# Altium footprint library Components.PcbLib: 139 footprints (part 1 of 9)
Each footprint in its own frame and in the unit in brackets; x right, y up, seen from the top. Pads: shape width x height; smd on the part's side, far side on the other; paste and mask are expansions set on the pad; w line width, h text height; cw(c..) or ccw(c..) is an arc to the next point about the centre after c.
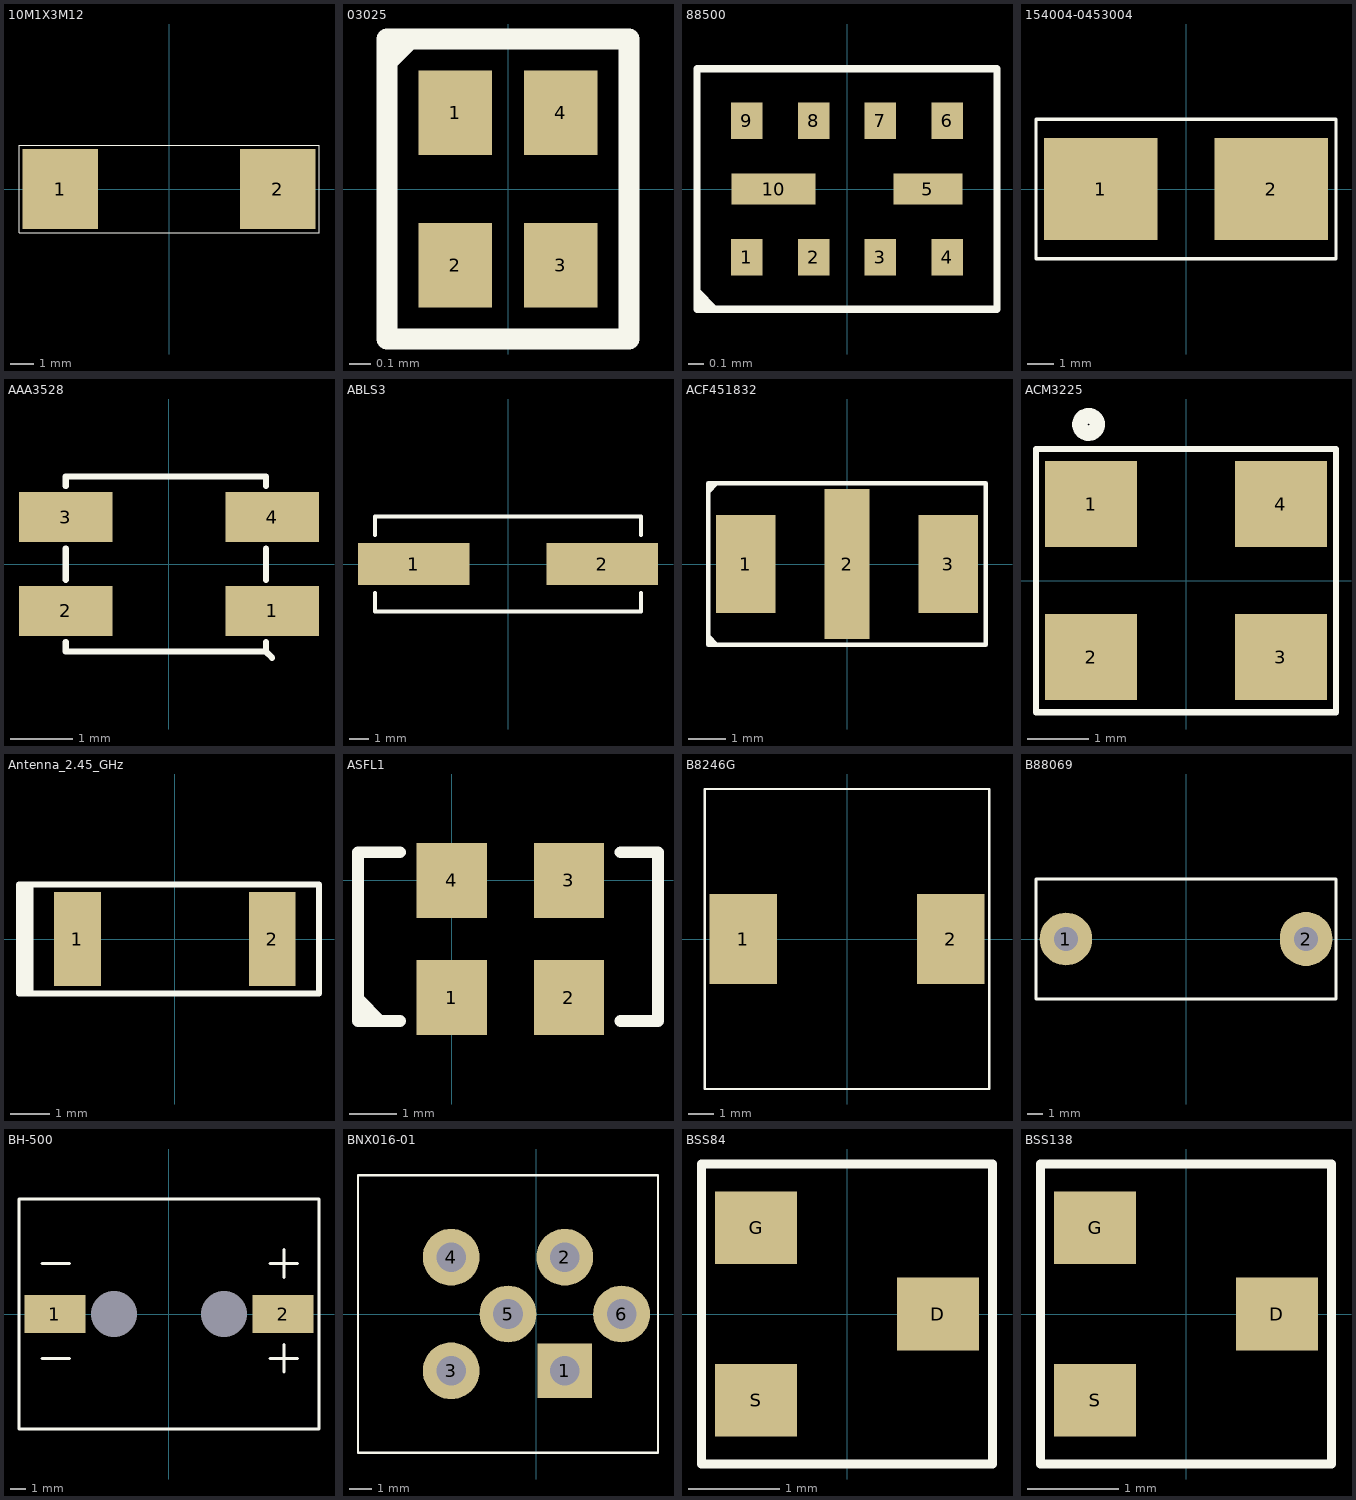
[diagram p0: the footprints below, top view; thin cyan lines are the x and y axes]

## 10M1X3M12 [mm]
pads (2):
  rect 3.25x3.45 smd paste-0.3 mask+0.1: 1(-4.675,0) 2(4.675,0)
Top Overlay:
  lines w0.05: -6.45,-1.875 6.45,-1.875 6.45,1.875 -6.45,1.875 -6.45,-1.875
3D body "SW3dPS-OMNI-BLOK littelfuse.STEP": height 3.81, standoff 0, extent -4.615,-2.6 5.215,2.43

## 03025 [mm]
pads (4):
  rect 0.35x0.4 smd paste-0.04 mask+0.03: 1(-0.25,0.363) 2(-0.25,-0.363) 3(0.25,-0.363) 4(0.25,0.363)
Top Overlay:
  region: -0.575,0.713 -0.4,0.713 -0.563,0.55 -0.575,0.55
  lines w0.1: -0.575,-0.712 -0.575,0.713 0.575,0.713 0.575,-0.712 -0.575,-0.712
3D body: height 0.5, standoff 0, extent -0.4,-0.387 0.4,0.388

## 88500 [mm]
pads (10):
  rect 0.21x0.245 smd paste-0.02 mask+0.02: 1(-0.667,-0.455) 2(-0.222,-0.455) 3(0.222,-0.455) 4(0.667,-0.455) 6(0.667,0.455) 7(0.222,0.455) 8(-0.222,0.455) 9(-0.667,0.455)
  rect 0.46x0.21 smd paste-0.02 mask+0.02: 5(0.54,0)
  rect 0.56x0.21 smd paste-0.02 mask+0.02: 10(-0.489,0)
Top Overlay:
  region: -1,-0.65 -0.85,-0.8 -1,-0.8
  lines w0.05: -1,-0.8 -1,0.8 1,0.8 1,-0.8 -1,-0.8

## 154004-0453004 [mm]
pads (2):
  rect 4.24x3.813 smd paste-0.4: 1(-3.185,0) 2(3.185,0)
Top Overlay:
  lines w0.12: -5.6,-2.6 -5.6,2.6 5.6,2.6 5.6,-2.6 -5.6,-2.6
3D body "SW3dPS-OMNI-BLOK littelfuse.STEP": height 3.81, standoff 0, extent -4.865,-2.43 4.965,2.6

## AAA3528 [mm]
pads (4):
  rect 1.5x0.8 smd paste-0.1 mask+0.08: 1(1.65,-0.75) 2(-1.65,-0.75) 3(-1.65,0.75) 4(1.65,0.75)
Top Overlay:
  lines w0.1: -1.65,-1.25 -1.65,-1.4 1.55,-1.4 ; -1.65,-0.25 -1.65,0.25 ; -1.65,1.25 -1.65,1.4 1.55,1.4 1.55,1.25 ; 1.55,-1.25 1.55,-1.4 ; 1.55,-0.25 1.55,0.25 ; 1.65,-1.5 1.55,-1.4 ; 1.55,-1.4 1.55,-1.4
3D body: height 2, standoff 0.1, extent -1.7,-1.45 1.6,1.45

## ABLS3 [mm] "Precision Wire Wound Inductor, 2-Leads, Body 12,7x4,7mm, IPC Medium Density"
height 2.5
pads (2):
  rect 5.6x2.1 smd paste-0.2: 1(-4.75,0) 2(4.75,0)
Top Overlay:
  lines w0.2: -6.7,-1.45 -6.7,-2.4 6.7,-2.4 6.7,-1.45 ; -6.7,1.45 -6.7,2.4 6.7,2.4 6.7,1.45
3D body "User Library-ABLS2.step": height 4, standoff 0, extent -6.72,-2.45 6.58,2.4

## ACF451832 [mm] "Chip Resistor, 2-Leads, Body 4,5x1,8mm, IPC Medium Density"
height 3.5
pads (3):
  rect 1.6x2.6 smd paste-0.18: 1(-2.7,0) 3(2.7,0)
  rect 1.2x4 smd paste-0.12: 2(0,0)
Top Overlay:
  region: -3.7,-1.85 -3.4,-2.15 -3.7,-2.15
  region: -3.7,1.85 -3.4,2.15 -3.7,2.15
  lines w0.12: -3.7,-2.15 3.7,-2.15 3.7,2.15 -3.7,2.15 -3.7,-2.15
Mechanical 15:
  text "LCR Filters" at 13.61,8.15 h1.52
3D body: height 3.5, standoff 0, extent -2.45,-1 2.45,1

## ACM3225 [mm]
pads (4):
  rect 1.5x1.4 smd paste-0.14 mask+0.1: 1(-1.55,1.25) 2(-1.55,-1.25) 3(1.55,-1.25) 4(1.55,1.25)
Top Overlay:
  circle w0.254: c-1.591,2.55 r0.141
  lines w0.1: -2.45,-2.15 2.45,-2.15 2.45,2.15 -2.45,2.15 -2.45,-2.15
3D body: height 2.3, standoff 0, extent -1.749,-1.349 1.649,1.35

## Antenna_2.45_GHz [mm]
pads (2):
  rect 1.2x2.4 smd paste-0.1 mask+0.102: 1(-2.5,0) 2(2.5,0)
Top Overlay:
  lines w0.15: -3.9,-1.4 -3.9,1.4 ; -3.8,-1.4 -3.8,1.4 ; -3.7,-1.4 -3.7,1.4 ; -4,-1.4 3.7,-1.4 3.7,1.4 -4,1.4 -4,-1.4
3D body: height 1.11, standoff 0, extent 2.001,-0.999 2.499,0.999
3D body: height 1.11, standoff 0, extent -2.499,-0.999 -2.001,0.999
3D body: height 1.1, standoff 0, extent -2.499,-0.999 2.499,0.999

## ASFL1 [mm]
pads (4):
  rect 1.5x1.6 smd paste-0.15: 1(0,-2.5) 2(2.5,-2.5) 3(2.5,0) 4(0,0)
Top Overlay:
  region: -2,-2.35 -1.35,-3 -2,-3
  lines w0.254: -1.1,-3 -2,-3 -2,0.6 -1.1,0.6 ; 3.6,-3 4.4,-3 4.4,0.6 3.6,0.6
3D body: height 1.2, standoff 0.7, extent -1.399,-2.399 3.799,-0.001
3D body: height 0.7, standoff 0, extent -1.875,-2.875 4.275,0.475

## B8246G [mm]
pads (2):
  rect 2.7x3.6 smd paste-0.2: 1(-4.15,0) 2(4.15,0)
Top Overlay:
  lines w0.1: -5.7,-6 5.7,-6 5.7,6 -5.7,6 -5.7,-6
3D body "B82464G4 (10.4-10.4-4.8).STEP": height 4.9, standoff 0.01, extent -5.38,-5.19 5.42,5.21

## B88069 [mm]
pads (2):
  round 3.5 hole 1.6: 1(-8,0)
  oval 3.5x3.6 hole 1.6: 2(8,0)
Top Overlay:
  lines w0.2: -10,-4 -10,4 10,4 10,-4 -10,-4
3D body "User Library-EC75X.step": height 8.45, standoff 0.25, extent -2.95,-4.1 2.95,4.1

## BH-500 [mm]
pads (4):
  rect 4x2.5 smd paste-0.4: 1(-7.45,0) 2(7.45,0)
  round 0 hole 3 unplated: ""(-3.6,0) ""(3.6,0)
Top Overlay:
  lines w0.2: -8.3,-2.9 -6.5,-2.9 ; -8.3,3.3 -6.5,3.3 ; 6.6,-2.9 8.4,-2.9 ; 6.6,3.3 8.4,3.3 ; 7.5,-3.8 7.5,-2 ; 7.5,2.4 7.5,4.2 ; -9.8,-7.5 -9.8,7.5 9.8,7.5 9.8,-7.5 -9.8,-7.5

## BNX016-01 [mm]
pads (6):
  rect 2.4x2.4 / inner round 2.5 / far side rect 2.4x2.4 hole 1.3 paste-0.04: 1(1.25,-2.5)
  round 2.5 hole 1.3 paste-0.04: 2(1.25,2.5) 3(-3.75,-2.5) 4(-3.75,2.5) 5(-1.25,0) 6(3.75,0)
Top Overlay:
  lines w0.1: -7.85,-6.1 5.35,-6.1 5.35,6.1 -7.85,6.1 -7.85,-6.1
3D body: height 8.5, standoff 0.01, extent -7.46,-5.56 4.74,5.63
3D body: height 3, standoff -7, extent -4.198,-2.95 -3.302,-2.052
3D body: height 3, standoff -7, extent 0.804,-2.95 1.7,-2.052
3D body: height 3, standoff -7, extent -1.688,-0.45 -0.792,0.448
3D body: height 3, standoff -7, extent 3.302,-0.45 4.198,0.448
3D body: height 3, standoff -7, extent 0.802,2.04 1.698,2.938
3D body: height 3, standoff -7, extent -4.198,2.04 -3.302,2.938

## BSS84 [mm]
pads (3):
  rect 0.9x0.8 smd paste-0.08 mask+0.08: D(1,0) G(-1,0.95) S(-1,-0.95)
Top Overlay:
  lines w0.1: -1.6,-1.65 1.6,-1.65 1.6,1.65 -1.6,1.65 -1.6,-1.65
3D body "SOT-23.STEP": height 1.1, standoff 0, extent -1.075,-1.55 1.225,1.45

## BSS138 [mm]
pads (3):
  rect 0.9x0.8 smd paste-0.08 mask+0.08: D(1,0) G(-1,0.95) S(-1,-0.95)
Top Overlay:
  lines w0.1: -1.6,-1.65 -1.6,1.65 1.6,1.65 1.6,-1.65 -1.6,-1.65
3D body "SOT-23.STEP": height 1.1, standoff 0, extent -1.075,-1.55 1.225,1.45